# Altium footprint library LUMI_Standard_Auto_Soldering_LIB.PcbLib: 344 footprints (part 10 of 22)
Each footprint in its own frame and in the unit in brackets; x right, y up, seen from the top. Pads: shape width x height; smd on the part's side, far side on the other; paste and mask are expansions set on the pad; w line width, h text height; cw(c..) or ccw(c..) is an arc to the next point about the centre after c.
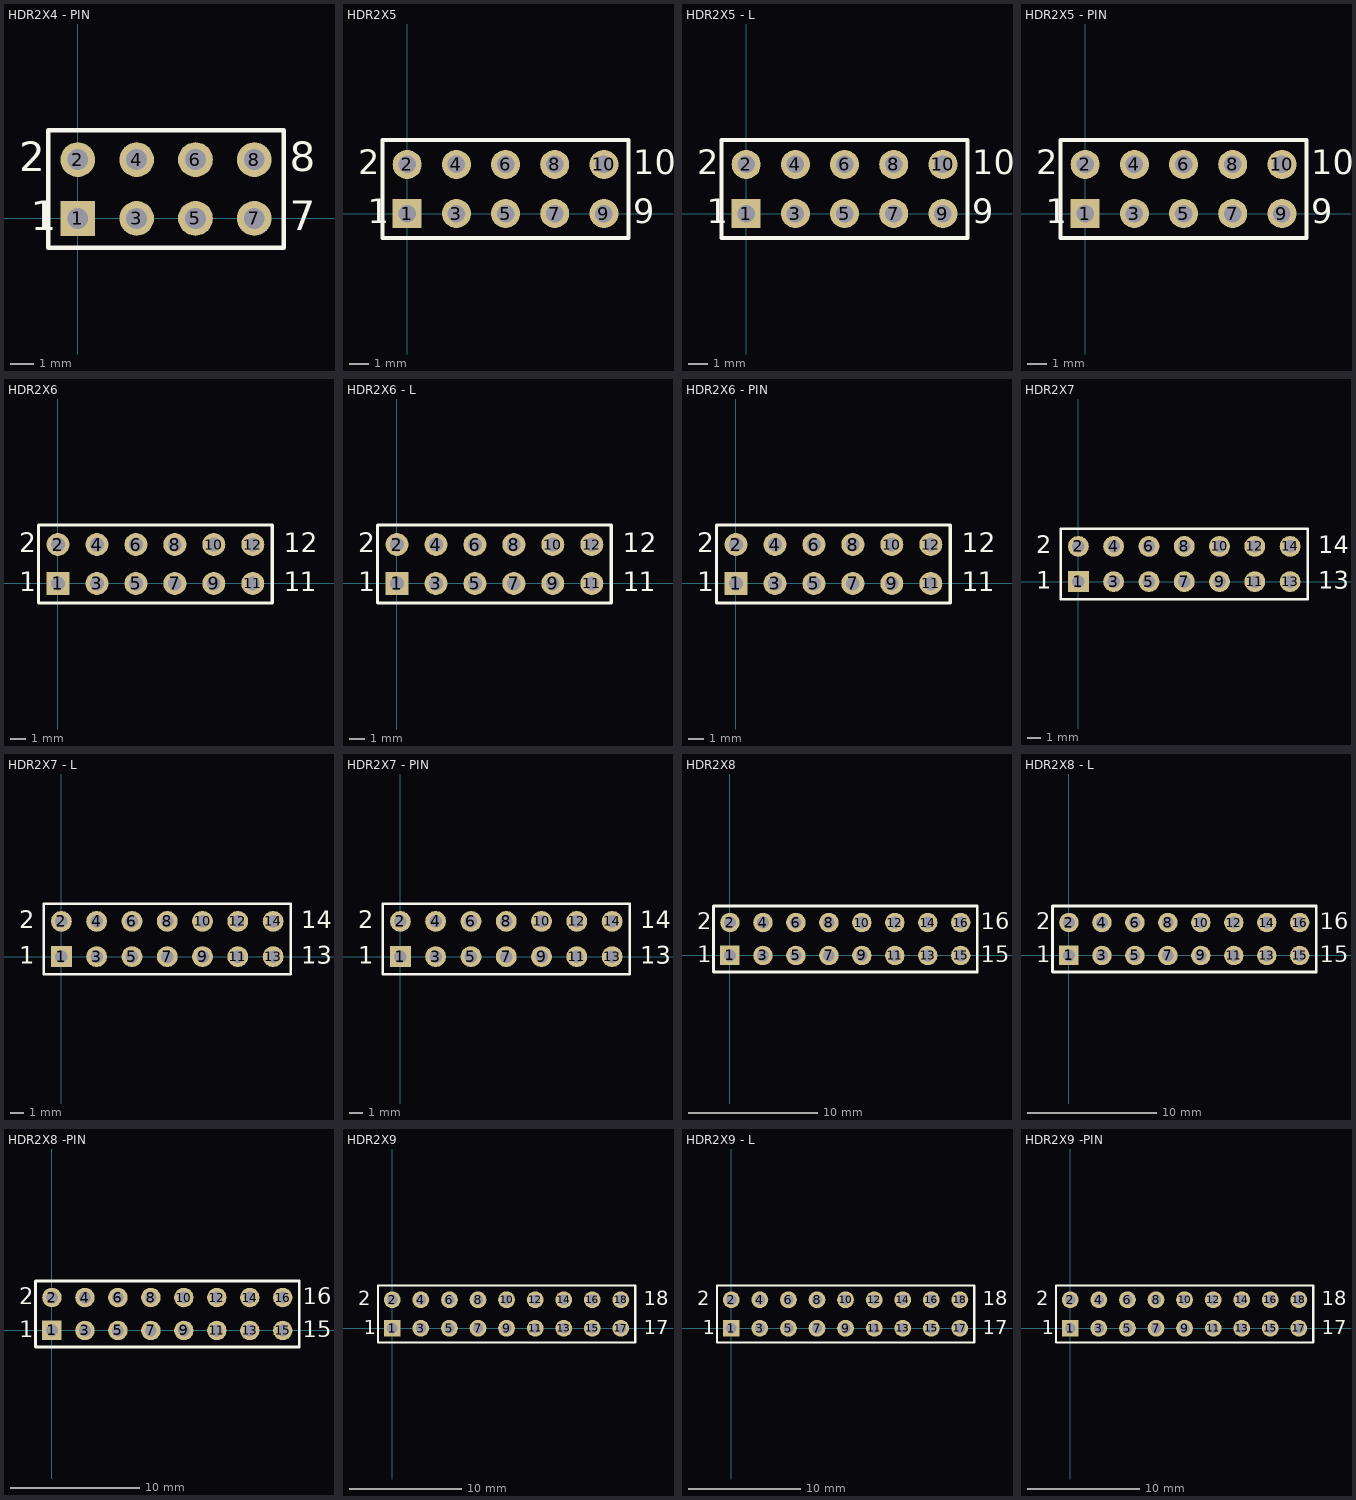
[diagram p9: the footprints below, top view; thin cyan lines are the x and y axes]

## HDR2X4 - PIN [mm] "Connector; Header; 4x2 Position"
pads (8):
  rect 1.5x1.5 hole 0.9: 1(0,0)
  round 1.5 hole 0.9: 2(0,2.54) 3(2.54,0) 4(2.54,2.54) 5(5.08,0) 6(5.08,2.54) 7(7.62,0) 8(7.62,2.54)
Top Overlay:
  lines w0.2: -1.27,-1.27 -1.27,3.81 8.89,3.81 8.89,-1.27 -1.27,-1.27
  text "8" at 9.144,2.032 h1.27
  text "7" at 9.144,-0.508 h1.27
  text "1" at -2.032,-0.508 h1.27
  text "2" at -2.54,2.032 h1.27
3D body: height 6.02, standoff -3.1, extent -1.245,-1.27 1.295,3.81
3D body: height 6.02, standoff -3.1, extent 1.27,-1.27 3.81,3.81
3D body: height 6.02, standoff -3.1, extent 3.81,-1.27 6.35,3.81
3D body: height 6.02, standoff -3.1, extent 6.325,-1.27 8.865,3.81

## HDR2X5 [mm] "Connector; Header; 5x2 Position"
pads (10):
  rect 1.5x1.5 hole 0.9: 1(0,0)
  round 1.5 hole 0.9: 2(0,2.54) 3(2.54,0) 4(2.54,2.54) 5(5.08,0) 6(5.08,2.54) 7(7.62,0) 8(7.62,2.54) 9(10.16,0) 10(10.16,2.54)
Top Overlay:
  lines w0.2: -1.27,-1.27 11.43,-1.27 11.43,3.81 -1.27,3.81 -1.27,-1.27
  text "10" at 11.684,2.032 h1.27
  text "9" at 11.684,-0.508 h1.27
  text "1" at -2.032,-0.508 h1.27
  text "2" at -2.54,2.032 h1.27
3D body: height 8.4, standoff -3, extent -1.245,-1.255 11.455,3.745

## HDR2X5 - L [mm] "Connector; Header; 5x2 Position"
pads (10):
  rect 1.5x1.5 hole 0.9: 1(0,0)
  round 1.5 hole 0.9: 2(0,2.54) 3(2.54,0) 4(2.54,2.54) 5(5.08,0) 6(5.08,2.54) 7(7.62,0) 8(7.62,2.54) 9(10.16,0) 10(10.16,2.54)
Top Overlay:
  lines w0.2: -1.27,-1.27 11.43,-1.27 11.43,3.81 -1.27,3.81 -1.27,-1.27
  text "10" at 11.684,2.032 h1.27
  text "9" at 11.684,-0.508 h1.27
  text "1" at -2.032,-0.508 h1.27
  text "2" at -2.54,2.032 h1.27
3D body: height 3.2, standoff -5.08, extent 8.814,-9.435 11.354,2.984
3D body: height 3.2, standoff -5.08, extent 6.401,-9.435 8.941,2.984
3D body: height 3.2, standoff -5.08, extent 3.886,-9.435 6.426,2.984
3D body: height 3.2, standoff -5.08, extent 1.473,-9.461 4.013,2.958
3D body: height 3.2, standoff -5.08, extent -0.991,-9.486 1.549,2.933

## HDR2X5 - PIN [mm] "Connector; Header; 5x2 Position"
pads (10):
  rect 1.5x1.5 hole 0.9: 1(0,0)
  round 1.5 hole 0.9: 2(0,2.54) 3(2.54,0) 4(2.54,2.54) 5(5.08,0) 6(5.08,2.54) 7(7.62,0) 8(7.62,2.54) 9(10.16,0) 10(10.16,2.54)
Top Overlay:
  lines w0.2: -1.27,-1.27 -1.27,3.81 11.43,3.81 11.43,-1.27 -1.27,-1.27
  text "2" at -2.54,2.032 h1.27
  text "1" at -2.032,-0.508 h1.27
  text "9" at 11.684,-0.508 h1.27
  text "10" at 11.684,2.032 h1.27
3D body: height 6.02, standoff -3.1, extent 8.865,-1.27 11.405,3.81
3D body: height 6.02, standoff -3.1, extent 6.325,-1.27 8.865,3.81
3D body: height 6.02, standoff -3.1, extent 3.785,-1.27 6.325,3.81
3D body: height 6.02, standoff -3.1, extent 1.245,-1.27 3.785,3.81
3D body: height 6.02, standoff -3.1, extent -1.27,-1.27 1.27,3.81

## HDR2X6 [mm] "Connector; Header; 6x2 Position"
pads (12):
  rect 1.5x1.5 hole 0.9: 1(0,0)
  round 1.5 hole 0.9: 2(0,2.54) 3(2.54,0) 4(2.54,2.54) 5(5.08,0) 6(5.08,2.54) 7(7.62,0) 8(7.62,2.54) 9(10.16,0) 10(10.16,2.54) 11(12.7,0) 12(12.7,2.54)
Top Overlay:
  lines w0.2: -1.27,-1.27 13.97,-1.27 13.97,3.81 -1.27,3.81 -1.27,-1.27
  text "12" at 14.732,2.032 h1.27
  text "1" at 15.748,-0.508 h1.27
  text "1" at 14.732,-0.508 h1.27
  text "1" at -2.54,-0.508 h1.27
  text "2" at -2.54,2.032 h1.27
3D body: height 8.4, standoff -3, extent 6.376,-1.23 13.996,3.77
3D body: height 8.4, standoff -3, extent -1.143,-1.23 6.477,3.77

## HDR2X6 - L [mm] "Connector; Header; 6x2 Position"
pads (12):
  rect 1.5x1.5 hole 0.9: 1(0,0)
  round 1.5 hole 0.9: 2(0,2.54) 3(2.54,0) 4(2.54,2.54) 5(5.08,0) 6(5.08,2.54) 7(7.62,0) 8(7.62,2.54) 9(10.16,0) 10(10.16,2.54) 11(12.7,0) 12(12.7,2.54)
Top Overlay:
  lines w0.2: -1.27,-1.27 13.97,-1.27 13.97,3.81 -1.27,3.81 -1.27,-1.27
  text "12" at 14.732,2.032 h1.27
  text "1" at 15.748,-0.508 h1.27
  text "1" at 14.732,-0.508 h1.27
  text "1" at -2.54,-0.508 h1.27
  text "2" at -2.54,2.032 h1.27
3D body: height 3.2, standoff -5.08, extent -1.194,-9.499 1.346,2.919
3D body: height 3.2, standoff -5.08, extent 1.295,-9.525 3.835,2.894
3D body: height 3.2, standoff -5.08, extent 3.835,-9.537 6.375,2.882
3D body: height 3.2, standoff -5.08, extent 6.299,-9.525 8.839,2.894
3D body: height 3.2, standoff -5.08, extent 8.839,-9.525 11.379,2.894
3D body: height 3.2, standoff -5.08, extent 11.354,-9.511 13.894,2.907

## HDR2X6 - PIN [mm] "Connector; Header; 6x2 Position"
pads (12):
  rect 1.5x1.5 hole 0.9: 1(0,0)
  round 1.5 hole 0.9: 2(0,2.54) 3(2.54,0) 4(2.54,2.54) 5(5.08,0) 6(5.08,2.54) 7(7.62,0) 8(7.62,2.54) 9(10.16,0) 10(10.16,2.54) 11(12.7,0) 12(12.7,2.54)
Top Overlay:
  lines w0.2: -1.27,-1.27 -1.27,3.81 13.97,3.81 13.97,-1.27 -1.27,-1.27
  text "2" at -2.54,2.032 h1.27
  text "1" at -2.54,-0.508 h1.27
  text "1" at 14.732,-0.508 h1.27
  text "1" at 15.748,-0.508 h1.27
  text "12" at 14.732,2.032 h1.27
3D body: height 6.02, standoff -3.1, extent 11.405,-1.27 13.945,3.81
3D body: height 6.02, standoff -3.1, extent 8.865,-1.27 11.405,3.81
3D body: height 6.02, standoff -3.1, extent 6.35,-1.27 8.89,3.81
3D body: height 6.02, standoff -3.1, extent 3.81,-1.27 6.35,3.81
3D body: height 6.02, standoff -3.1, extent 1.27,-1.27 3.81,3.81
3D body: height 6.02, standoff -3.1, extent -1.27,-1.27 1.27,3.81

## HDR2X7 [mm] "Connector; Header; 7x2 Position"
pads (14):
  rect 1.5x1.5 hole 0.9: 1(0,0)
  round 1.5 hole 0.9: 2(0,2.54) 3(2.54,0) 4(2.54,2.54) 5(5.08,0) 6(5.08,2.54) 7(7.62,0) 8(7.62,2.54) 9(10.16,0) 10(10.16,2.54) 11(12.7,0) 12(12.7,2.54) 13(15.24,0) 14(15.24,2.54)
Top Overlay:
  lines w0.2: -1.27,-1.27 -1.27,3.81 16.51,3.81 16.51,-1.27 -1.27,-1.27
  text "2" at -3.048,2.032 h1.27
  text "1" at -3.048,-0.508 h1.27
  text "14" at 17.272,2.032 h1.27
  text "13" at 17.272,-0.508 h1.27
3D body: height 8.4, standoff -3, extent -1.219,-1.255 16.561,3.745

## HDR2X7 - L [mm] "Connector; Header; 7x2 Position"
pads (14):
  rect 1.5x1.5 hole 0.9: 1(0,0)
  round 1.5 hole 0.9: 2(0,2.54) 3(2.54,0) 4(2.54,2.54) 5(5.08,0) 6(5.08,2.54) 7(7.62,0) 8(7.62,2.54) 9(10.16,0) 10(10.16,2.54) 11(12.7,0) 12(12.7,2.54) 13(15.24,0) 14(15.24,2.54)
Top Overlay:
  lines w0.2: -1.27,-1.27 -1.27,3.81 16.51,3.81 16.51,-1.27 -1.27,-1.27
  text "2" at -3.048,2.032 h1.27
  text "1" at -3.048,-0.508 h1.27
  text "14" at 17.272,2.032 h1.27
  text "13" at 17.272,-0.508 h1.27
3D body: height 3.2, standoff -5.08, extent 13.792,-9.435 16.332,2.984
3D body: height 3.2, standoff -5.08, extent 11.354,-9.41 13.894,3.009
3D body: height 3.2, standoff -5.08, extent 8.839,-9.384 11.379,3.034
3D body: height 3.2, standoff -5.08, extent 6.325,-9.384 8.865,3.034
3D body: height 3.2, standoff -5.08, extent 3.81,-9.384 6.35,3.034
3D body: height 3.2, standoff -5.08, extent 1.346,-9.334 3.886,3.085
3D body: height 3.2, standoff -5.08, extent -1.143,-9.334 1.397,3.085

## HDR2X7 - PIN [mm] "Connector; Header; 7x2 Position"
pads (14):
  rect 1.5x1.5 hole 0.9: 1(0,0)
  round 1.5 hole 0.9: 2(0,2.54) 3(2.54,0) 4(2.54,2.54) 5(5.08,0) 6(5.08,2.54) 7(7.62,0) 8(7.62,2.54) 9(10.16,0) 10(10.16,2.54) 11(12.7,0) 12(12.7,2.54) 13(15.24,0) 14(15.24,2.54)
Top Overlay:
  lines w0.2: -1.27,-1.27 -1.27,3.81 16.51,3.81 16.51,-1.27 -1.27,-1.27
  text "2" at -3.048,2.032 h1.27
  text "1" at -3.048,-0.508 h1.27
  text "14" at 17.272,2.032 h1.27
  text "13" at 17.272,-0.508 h1.27
3D body: height 6.02, standoff -3.1, extent -1.219,-1.27 1.321,3.81
3D body: height 6.02, standoff -3.1, extent 1.27,-1.27 3.81,3.81
3D body: height 6.02, standoff -3.1, extent 3.81,-1.27 6.35,3.81
3D body: height 6.02, standoff -3.1, extent 6.35,-1.27 8.89,3.81
3D body: height 6.02, standoff -3.1, extent 8.89,-1.27 11.43,3.81
3D body: height 6.02, standoff -3.1, extent 11.43,-1.27 13.97,3.81
3D body: height 6.02, standoff -3.1, extent 13.919,-1.27 16.459,3.81

## HDR2X8 [mm] "Connector; Header; 8x2 Position"
pads (16):
  rect 1.5x1.5 hole 0.9: 1(0,0)
  round 1.5 hole 0.9: 2(0,2.54) 3(2.54,0) 4(2.54,2.54) 5(5.08,0) 6(5.08,2.54) 7(7.62,0) 8(7.62,2.54) 9(10.16,0) 10(10.16,2.54) 11(12.7,0) 12(12.7,2.54) 13(15.24,0) 14(15.24,2.54) 15(17.78,0) 16(17.78,2.54)
Top Overlay:
  lines w0.2: -1.27,-1.27 -1.27,3.81 19.05,3.81 19.05,-1.27 -1.27,-1.27
  text "2" at -2.54,2.032 h1.27
  text "1" at -2.54,-0.508 h1.27
  text "15" at 19.304,-0.508 h1.27
  text "16" at 19.304,2.032 h1.27
3D body: height 8.4, standoff -3, extent -1.244,-1.255 19.076,3.745

## HDR2X8 - L [mm] "Connector; Header; 8x2 Position"
pads (16):
  rect 1.5x1.5 hole 0.9: 1(0,0)
  round 1.5 hole 0.9: 2(0,2.54) 3(2.54,0) 4(2.54,2.54) 5(5.08,0) 6(5.08,2.54) 7(7.62,0) 8(7.62,2.54) 9(10.16,0) 10(10.16,2.54) 11(12.7,0) 12(12.7,2.54) 13(15.24,0) 14(15.24,2.54) 15(17.78,0) 16(17.78,2.54)
Top Overlay:
  lines w0.2: -1.27,-1.27 19.05,-1.27 19.05,3.81 -1.27,3.81 -1.27,-1.27
  text "16" at 19.304,2.032 h1.27
  text "15" at 19.304,-0.508 h1.27
  text "1" at -2.54,-0.508 h1.27
  text "2" at -2.54,2.032 h1.27
3D body: height 3.2, standoff -5.08, extent 16.408,-9.384 18.948,3.034
3D body: height 3.2, standoff -5.08, extent 13.868,-9.384 16.408,3.034
3D body: height 3.2, standoff -5.08, extent 11.379,-9.384 13.919,3.034
3D body: height 3.2, standoff -5.08, extent 8.839,-9.384 11.379,3.034
3D body: height 3.2, standoff -5.08, extent 6.299,-9.41 8.839,3.009
3D body: height 3.2, standoff -5.08, extent 3.759,-9.41 6.299,3.009
3D body: height 3.2, standoff -5.08, extent 1.245,-9.41 3.785,3.009
3D body: height 3.2, standoff -5.08, extent -1.041,-9.41 1.499,3.009

## HDR2X8 -PIN [mm] "Connector; Header; 8x2 Position"
pads (16):
  rect 1.5x1.5 hole 0.9: 1(0,0)
  round 1.5 hole 0.9: 2(0,2.54) 3(2.54,0) 4(2.54,2.54) 5(5.08,0) 6(5.08,2.54) 7(7.62,0) 8(7.62,2.54) 9(10.16,0) 10(10.16,2.54) 11(12.7,0) 12(12.7,2.54) 13(15.24,0) 14(15.24,2.54) 15(17.78,0) 16(17.78,2.54)
Top Overlay:
  lines w0.2: -1.27,-1.27 -1.27,3.81 19.05,3.81 19.05,-1.27 -1.27,-1.27
  text "2" at -2.54,2.032 h1.27
  text "1" at -2.54,-0.508 h1.27
  text "15" at 19.304,-0.508 h1.27
  text "16" at 19.304,2.032 h1.27
3D body: height 6.02, standoff -3.1, extent 16.332,-1.27 18.872,3.81
3D body: height 6.02, standoff -3.1, extent 13.843,-1.27 16.383,3.81
3D body: height 6.02, standoff -3.1, extent 11.303,-1.27 13.843,3.81
3D body: height 6.02, standoff -3.1, extent 8.814,-1.27 11.354,3.81
3D body: height 6.02, standoff -3.1, extent 6.299,-1.27 8.839,3.81
3D body: height 6.02, standoff -3.1, extent 3.759,-1.27 6.299,3.81
3D body: height 6.02, standoff -3.1, extent 1.219,-1.27 3.759,3.81
3D body: height 6.02, standoff -3.1, extent -1.27,-1.27 1.27,3.81

## HDR2X9 [mm] "Connector; Header; 9x2 Position"
pads (18):
  rect 1.5x1.5 hole 0.9: 1(0,0)
  round 1.5 hole 0.9: 2(0,2.54) 3(2.54,0) 4(2.54,2.54) 5(5.08,0) 6(5.08,2.54) 7(7.62,0) 8(7.62,2.54) 9(10.16,0) 10(10.16,2.54) 11(12.7,0) 12(12.7,2.54) 13(15.24,0) 14(15.24,2.54) 15(17.78,0) 16(17.78,2.54) 17(20.32,0) 18(20.32,2.54)
Top Overlay:
  lines w0.2: -1.27,-1.27 21.59,-1.27 21.59,3.81 -1.27,3.81 -1.27,-1.27
  text "18" at 22.352,2.032 h1.27
  text "17" at 22.352,-0.508 h1.27
  text "1" at -2.54,-0.508 h1.27
  text "2" at -3.048,2.032 h1.27
3D body: height 8.4, standoff -3, extent 8.89,-1.23 21.59,3.77
3D body: height 8.4, standoff -3, extent -1.321,-1.23 8.839,3.77

## HDR2X9 - L [mm] "Connector; Header; 9x2 Position"
pads (18):
  rect 1.5x1.5 hole 0.9: 1(0,0)
  round 1.5 hole 0.9: 2(0,2.54) 3(2.54,0) 4(2.54,2.54) 5(5.08,0) 6(5.08,2.54) 7(7.62,0) 8(7.62,2.54) 9(10.16,0) 10(10.16,2.54) 11(12.7,0) 12(12.7,2.54) 13(15.24,0) 14(15.24,2.54) 15(17.78,0) 16(17.78,2.54) 17(20.32,0) 18(20.32,2.54)
Top Overlay:
  lines w0.2: -1.27,-1.27 21.59,-1.27 21.59,3.81 -1.27,3.81 -1.27,-1.27
  text "18" at 22.352,2.032 h1.27
  text "17" at 22.352,-0.508 h1.27
  text "1" at -2.54,-0.508 h1.27
  text "2" at -3.048,2.032 h1.27
3D body: height 3.2, standoff -5.08, extent 18.999,-9.474 21.539,2.945
3D body: height 3.2, standoff -5.08, extent 16.459,-9.461 18.999,2.958
3D body: height 3.2, standoff -5.08, extent 14.021,-9.461 16.561,2.958
3D body: height 3.2, standoff -5.08, extent 11.481,-9.461 14.021,2.958
3D body: height 3.2, standoff -5.08, extent 8.915,-9.461 11.455,2.958
3D body: height 3.2, standoff -5.08, extent 6.375,-9.461 8.915,2.958
3D body: height 3.2, standoff -5.08, extent 3.835,-9.461 6.375,2.958
3D body: height 3.2, standoff -5.08, extent 1.321,-9.461 3.861,2.958
3D body: height 3.2, standoff -5.08, extent -1.194,-9.461 1.346,2.958

## HDR2X9 -PIN [mm] "Connector; Header; 9x2 Position"
pads (18):
  rect 1.5x1.5 hole 0.9: 1(0,0)
  round 1.5 hole 0.9: 2(0,2.54) 3(2.54,0) 4(2.54,2.54) 5(5.08,0) 6(5.08,2.54) 7(7.62,0) 8(7.62,2.54) 9(10.16,0) 10(10.16,2.54) 11(12.7,0) 12(12.7,2.54) 13(15.24,0) 14(15.24,2.54) 15(17.78,0) 16(17.78,2.54) 17(20.32,0) 18(20.32,2.54)
Top Overlay:
  lines w0.2: -1.27,-1.27 21.59,-1.27 21.59,3.81 -1.27,3.81 -1.27,-1.27
  text "18" at 22.352,2.032 h1.27
  text "17" at 22.352,-0.508 h1.27
  text "1" at -2.54,-0.508 h1.27
  text "2" at -3.048,2.032 h1.27
3D body: height 6.02, standoff -3.1, extent 18.974,-1.27 21.514,3.81
3D body: height 6.02, standoff -3.1, extent 16.434,-1.27 18.974,3.81
3D body: height 6.02, standoff -3.1, extent 13.919,-1.27 16.459,3.81
3D body: height 6.02, standoff -3.1, extent 11.379,-1.27 13.919,3.81
3D body: height 6.02, standoff -3.1, extent 8.839,-1.27 11.379,3.81
3D body: height 6.02, standoff -3.1, extent 6.299,-1.27 8.839,3.81
3D body: height 6.02, standoff -3.1, extent 3.759,-1.27 6.299,3.81
3D body: height 6.02, standoff -3.1, extent 1.245,-1.27 3.785,3.81
3D body: height 6.02, standoff -3.1, extent -1.27,-1.27 1.27,3.81